# Altium footprint library PcbLib.PcbLib: 25 footprints (part 1 of 2)
Each footprint in its own frame and in the unit in brackets; x right, y up, seen from the top. Pads: shape width x height; smd on the part's side, far side on the other; paste and mask are expansions set on the pad; w line width, h text height; cw(c..) or ccw(c..) is an arc to the next point about the centre after c.
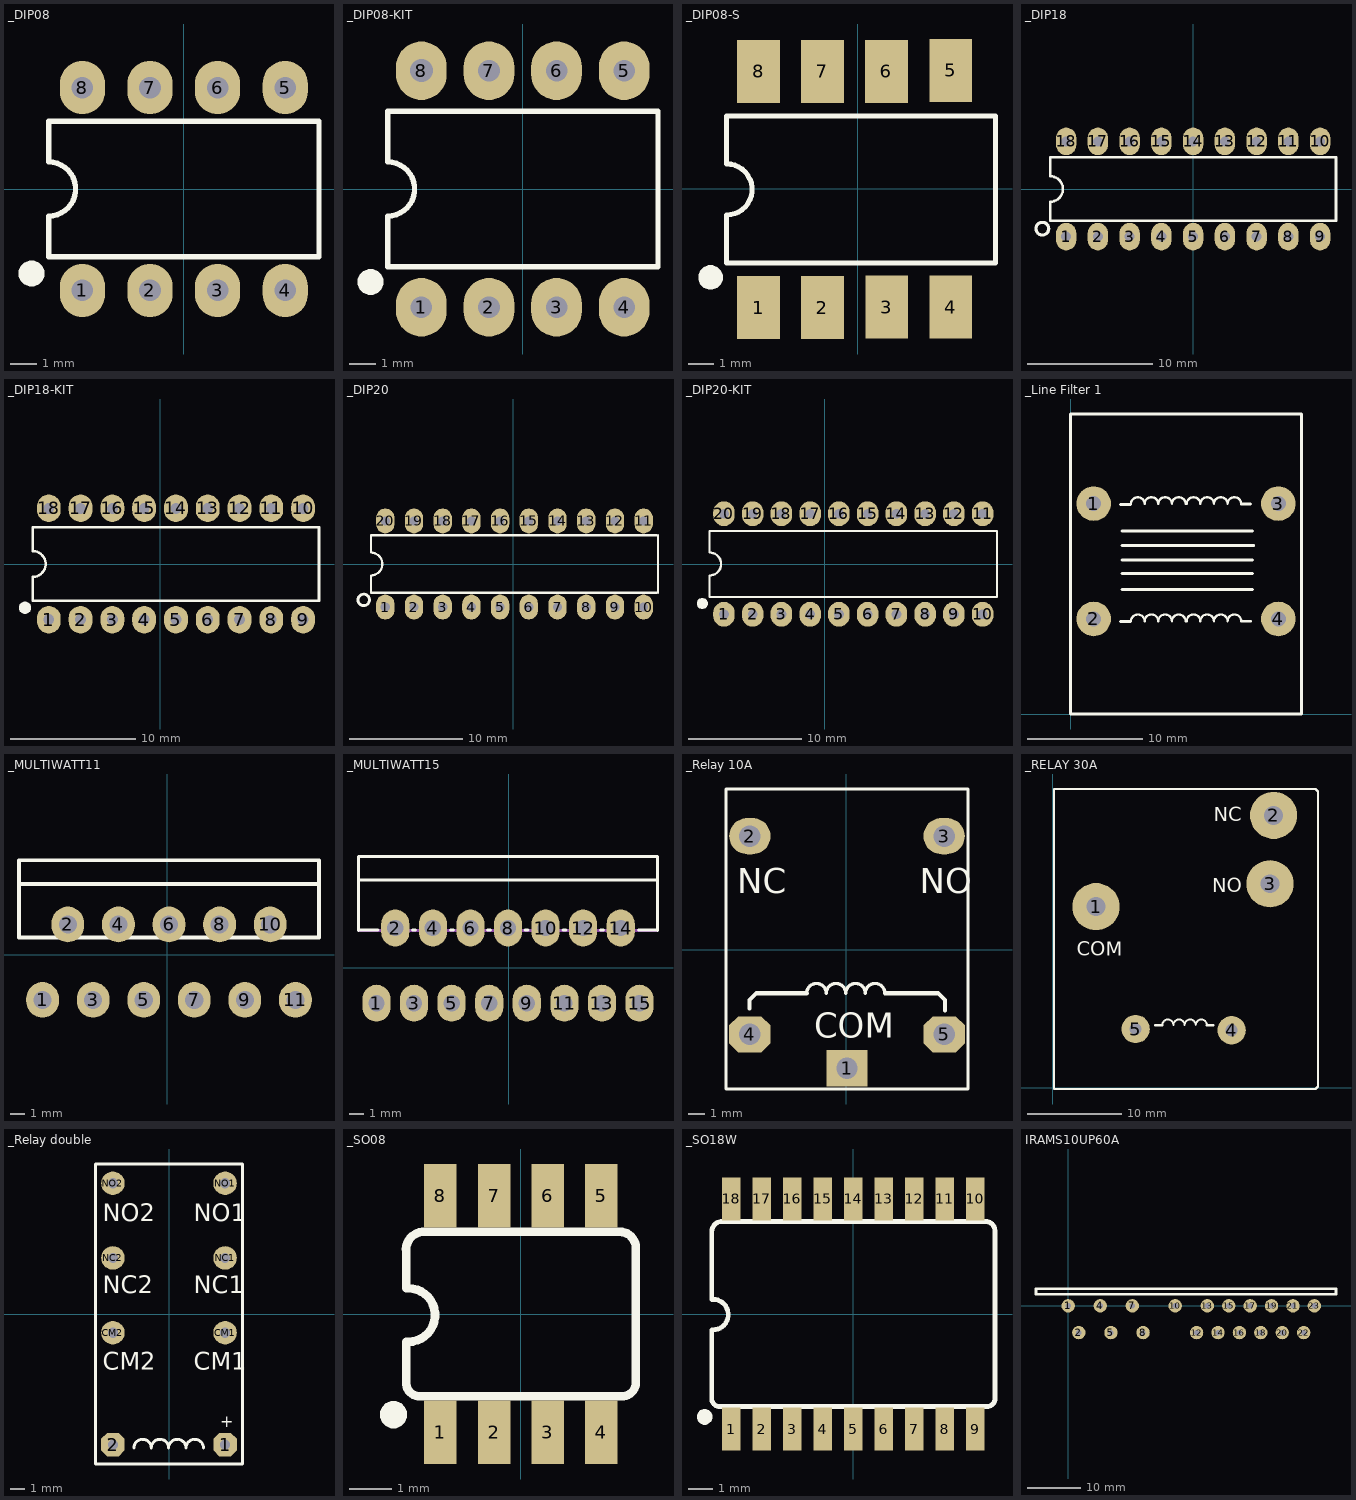
[diagram p0: the footprints below, top view; thin cyan lines are the x and y axes]

## _DIP08 [mm]
pads (8):
  oval 1.7x2 hole 0.813: 1(-3.81,-3.81) 2(-1.27,-3.81) 3(1.27,-3.81) 4(3.81,-3.81) 5(3.81,3.81) 6(1.27,3.81) 7(-1.27,3.81) 8(-3.81,3.81)
Top Overlay:
  region: -6.191,-3.175 -6.191,-3.08 -6.119,-2.905 -5.985,-2.771 -5.81,-2.699 -5.715,-2.699 -5.62,-2.699 -5.445,-2.771 -5.311,-2.905 -5.239,-3.08 -5.239,-3.175 -5.239,-3.27 -5.311,-3.445 -5.445,-3.579 -5.62,-3.651 -5.715,-3.651 -5.81,-3.651 -5.985,-3.579 -6.119,-3.445 -6.191,-3.27
  lines w0.203: -5.08,-2.54 5.08,-2.54 5.08,2.54 -5.08,2.54 -5.08,1.016 cw(c-5.08,0) -5.08,-1.016 -5.08,-2.54

## _DIP08-KIT [mm]
pads (8):
  oval 1.905x2.2 hole 0.813: 1(-3.81,-4.445) 2(-1.27,-4.445) 3(1.27,-4.445) 4(3.81,-4.445) 5(3.81,4.445) 6(1.27,4.445) 7(-1.27,4.445)
  oval 1.905x2.2 hole 0.864: 8(-3.81,4.445)
Top Overlay:
  region: -6.191,-3.492 -6.191,-3.398 -6.119,-3.223 -5.985,-3.089 -5.81,-3.016 -5.715,-3.016 -5.62,-3.016 -5.445,-3.089 -5.311,-3.223 -5.239,-3.398 -5.239,-3.492 -5.239,-3.587 -5.311,-3.762 -5.445,-3.896 -5.62,-3.969 -5.715,-3.969 -5.81,-3.969 -5.985,-3.896 -6.119,-3.762 -6.191,-3.587
  lines w0.203: -5.08,-2.921 -5.08,-1.016 ccw(c-5.08,0) -5.08,1.016 -5.08,2.921 5.08,2.921 5.08,-2.921 -5.08,-2.921
Top Solder:
  circle w0: c-3.81,4.445 r0.432
  circle w0: c-1.27,4.445 r0.432
  circle w0: c1.27,4.445 r0.432
  circle w0: c3.81,4.445 r0.432
  circle w0: c-3.81,-4.445 r0.432
  circle w0: c-1.27,-4.445 r0.432
  circle w0: c1.27,-4.445 r0.432
  circle w0: c3.81,-4.445 r0.432
Bottom Solder:
  circle w0: c-3.81,4.445 r1.067
  circle w0: c-1.27,4.445 r1.067
  circle w0: c1.27,4.445 r1.067
  circle w0: c3.81,4.445 r1.067
  circle w0: c-3.81,-4.445 r1.067
  circle w0: c-1.27,-4.445 r1.067
  circle w0: c1.27,-4.445 r1.067
  circle w0: c3.81,-4.445 r1.067

## _DIP08-S [mm]
pads (8):
  rect 1.7x2.5 smd: 1(-3.95,-4.718) 2(-1.41,-4.718) 3(1.143,-4.699) 4(3.683,-4.699) 5(3.683,4.699) 6(1.13,4.664) 7(-1.41,4.664) 8(-3.95,4.664)
Top Overlay:
  region: -6.331,-3.52 -6.331,-3.425 -6.259,-3.25 -6.125,-3.116 -5.95,-3.043 -5.855,-3.043 -5.76,-3.043 -5.585,-3.116 -5.451,-3.25 -5.379,-3.425 -5.379,-3.52 -5.379,-3.614 -5.451,-3.789 -5.585,-3.923 -5.76,-3.996 -5.855,-3.996 -5.95,-3.996 -6.125,-3.923 -6.259,-3.789 -6.331,-3.614
  lines w0.203: -5.22,-2.948 -5.22,-1.043 ccw(c-5.22,-0.027) -5.22,0.989 -5.22,2.894 5.461,2.894 5.461,-2.948 -5.22,-2.948
Top Solder:
  circle w0: c-3.95,4.664 r0.432
  circle w0: c-1.41,4.664 r0.432
  circle w0: c-3.95,-4.718 r0.432
  circle w0: c-1.41,-4.718 r0.432

## _DIP18 [mil]
pads (18):
  oval 64x86.61 hole 32: 1(-400,-150) 2(-300,-150) 3(-200,-150) 4(-100,-150) 5(0,-150) 6(100,-150) 7(200,-150) 8(300,-150) 9(400,-150) 10(400,150) 11(300,150) 12(200,150) 13(100,150) 14(0,150) 15(-100,150) 16(-200,150) 17(-300,150) 18(-400,150)
Top Overlay:
  circle w10: c-475,-125 r20
  lines w8: -450,-100 450,-100 450,100 -450,100 -450,40 cw(c-450,0) -450,-40 -450,-100

## _DIP18-KIT [mm]
pads (18):
  oval 1.905x2.2 hole 0.864: 1(-8.89,-4.445) 2(-6.35,-4.445) 3(-3.81,-4.445) 4(-1.27,-4.445) 5(1.27,-4.445) 6(3.81,-4.445) 7(6.35,-4.445) 8(8.89,-4.445) 9(11.43,-4.445) 10(11.43,4.445) 11(8.89,4.445) 12(6.35,4.445) 13(3.81,4.445) 14(1.27,4.445) 15(-1.27,4.445) 16(-3.81,4.445) 17(-6.35,4.445) 18(-8.89,4.445)
Top Overlay:
  region: -11.271,-3.492 -11.271,-3.398 -11.199,-3.223 -11.065,-3.089 -10.89,-3.016 -10.795,-3.016 -10.7,-3.016 -10.525,-3.089 -10.391,-3.223 -10.319,-3.398 -10.319,-3.492 -10.319,-3.587 -10.391,-3.762 -10.525,-3.896 -10.7,-3.969 -10.795,-3.969 -10.89,-3.969 -11.065,-3.896 -11.199,-3.762 -11.271,-3.587
  lines w0.203: -10.16,-2.921 -10.16,-1.016 ccw(c-10.16,0) -10.16,1.016 -10.16,2.921 12.7,2.921 12.7,-2.921 -10.16,-2.921
Top Solder:
  circle w0: c11.43,-4.445 r0.432
  circle w0: c11.43,4.445 r0.432
  circle w0: c-3.81,4.445 r0.432
  circle w0: c-1.27,4.445 r0.432
  circle w0: c1.27,4.445 r0.432
  circle w0: c3.81,4.445 r0.432
  circle w0: c6.35,4.445 r0.432
  circle w0: c8.89,4.445 r0.432
  circle w0: c8.89,-4.445 r0.432
  circle w0: c-6.35,-4.445 r0.432
  circle w0: c-3.81,-4.445 r0.432
  circle w0: c-1.27,-4.445 r0.432
  circle w0: c1.27,-4.445 r0.432
  circle w0: c3.81,-4.445 r0.432
  circle w0: c6.35,-4.445 r0.432
  circle w0: c-8.89,-4.445 r0.432
  circle w0: c-3.81,4.445 r0.432
  circle w0: c-3.81,4.445 r0.432
  circle w0: c-6.35,4.445 r0.432
  circle w0: c-8.89,4.445 r0.432
Bottom Solder:
  circle w0: c11.43,-4.445 r1.067
  circle w0: c11.43,4.445 r1.067
  circle w0: c-3.81,4.445 r1.067
  circle w0: c-1.27,4.445 r1.067
  circle w0: c1.27,4.445 r1.067
  circle w0: c3.81,4.445 r1.067
  circle w0: c6.35,4.445 r1.067
  circle w0: c8.89,4.445 r1.067
  circle w0: c8.89,-4.445 r1.067
  circle w0: c3.81,-4.445 r1.067
  circle w0: c6.35,-4.445 r1.067
  circle w0: c1.27,-4.445 r1.067
  circle w0: c-1.27,-4.445 r1.067
  circle w0: c-3.81,-4.445 r1.067
  circle w0: c-6.35,-4.445 r1.067
  circle w0: c-8.89,-4.445 r1.067
  circle w0: c-6.35,4.445 r1.067
  circle w0: c-8.89,4.445 r1.067

## _DIP20 [mil]
pads (20):
  oval 64x86.61 hole 32: 1(-445,-150) 2(-345,-150) 3(-245,-150) 4(-145,-150) 5(-45,-150) 6(55,-150) 7(155,-150) 8(255,-150) 9(355,-150) 10(455,-150) 11(455,150) 12(355,150) 13(255,150) 14(155,150) 15(55,150) 16(-45,150) 17(-145,150) 18(-245,150) 19(-345,150) 20(-445,150)
Top Overlay:
  circle w10: c-520,-125 r20
  lines w8: 500,-100 -495,-100 -495,-40 ccw(c-495,0) -495,40 -495,100 500,100 ; 505,-100 505,100

## _DIP20-KIT [mm]
pads (20):
  oval 1.905x2.2 hole 0.864: 1(-8.89,-4.445) 2(-6.35,-4.445) 3(-3.81,-4.445) 4(-1.27,-4.445) 5(1.27,-4.445) 6(3.81,-4.445) 7(6.35,-4.445) 8(8.89,-4.445) 9(11.43,-4.445) 10(13.97,-4.445) 11(13.97,4.445) 12(11.43,4.445) 13(8.89,4.445) 14(6.35,4.445) 15(3.81,4.445) 16(1.27,4.445) 17(-1.27,4.445) 18(-3.81,4.445) 19(-6.35,4.445) 20(-8.89,4.445)
Top Overlay:
  region: -11.271,-3.492 -11.271,-3.398 -11.199,-3.223 -11.065,-3.089 -10.89,-3.016 -10.795,-3.016 -10.7,-3.016 -10.525,-3.089 -10.391,-3.223 -10.319,-3.398 -10.319,-3.492 -10.319,-3.587 -10.391,-3.762 -10.525,-3.896 -10.7,-3.969 -10.795,-3.969 -10.89,-3.969 -11.065,-3.896 -11.199,-3.762 -11.271,-3.587
  lines w0.203: -10.16,-2.921 -10.16,-1.016 ccw(c-10.16,0) -10.16,1.016 -10.16,2.921 15.24,2.921 15.24,-2.921 -10.16,-2.921
Top Solder:
  circle w0: c11.43,-4.445 r0.432
  circle w0: c11.43,4.445 r0.432
  circle w0: c-3.81,4.445 r0.432
  circle w0: c-1.27,4.445 r0.432
  circle w0: c1.27,4.445 r0.432
  circle w0: c3.81,4.445 r0.432
  circle w0: c6.35,4.445 r0.432
  circle w0: c8.89,4.445 r0.432
  circle w0: c8.89,-4.445 r0.432
  circle w0: c-6.35,-4.445 r0.432
  circle w0: c-3.81,-4.445 r0.432
  circle w0: c-1.27,-4.445 r0.432
  circle w0: c1.27,-4.445 r0.432
  circle w0: c3.81,-4.445 r0.432
  circle w0: c6.35,-4.445 r0.432
  circle w0: c-8.89,-4.445 r0.432
  circle w0: c-3.81,4.445 r0.432
  circle w0: c-3.81,4.445 r0.432
  circle w0: c-6.35,4.445 r0.432
  circle w0: c-8.89,4.445 r0.432
  circle w0: c13.97,4.445 r0.432
  circle w0: c13.97,-4.445 r0.432
Bottom Solder:
  circle w0: c11.43,-4.445 r1.067
  circle w0: c11.43,4.445 r1.067
  circle w0: c-3.81,4.445 r1.067
  circle w0: c-1.27,4.445 r1.067
  circle w0: c1.27,4.445 r1.067
  circle w0: c3.81,4.445 r1.067
  circle w0: c6.35,4.445 r1.067
  circle w0: c8.89,4.445 r1.067
  circle w0: c8.89,-4.445 r1.067
  circle w0: c3.81,-4.445 r1.067
  circle w0: c6.35,-4.445 r1.067
  circle w0: c1.27,-4.445 r1.067
  circle w0: c-1.27,-4.445 r1.067
  circle w0: c-3.81,-4.445 r1.067
  circle w0: c-6.35,-4.445 r1.067
  circle w0: c-8.89,-4.445 r1.067
  circle w0: c-6.35,4.445 r1.067
  circle w0: c-8.89,4.445 r1.067
  circle w0: c13.97,4.445 r1.067
  circle w0: c13.97,-4.445 r1.067

## _Line Filter 1 [mm]
pads (4):
  round 3 hole 1.3: 1(2,18.238) 2(2,8.238) 3(18,18.238) 4(18,8.238)
Top Overlay:
  lines w0.2: 5.233,8.036 cw(c5.824,8.036) 6.415,8.036 cw(c7.006,8.036) 7.597,8.036 cw(c8.188,8.036) 8.779,8.036 cw(c9.37,8.036) 9.961,8.036 ; 5.233,18.196 cw(c5.824,18.196) 6.415,18.196 cw(c7.006,18.196) 7.597,18.196 cw(c8.188,18.196) 8.779,18.196 cw(c9.37,18.196) 9.961,18.196 ; 10.059,8.036 cw(c10.65,8.036) 11.241,8.036 cw(c11.832,8.036) 12.423,8.036 cw(c13.014,8.036) 13.605,8.036 cw(c14.196,8.036) 14.787,8.036 ; 10.059,18.196 cw(c10.65,18.196) 11.241,18.196 cw(c11.832,18.196) 12.423,18.196 cw(c13.014,18.196) 13.605,18.196 cw(c14.196,18.196) 14.787,18.196
  lines w0.25: 4.318,8.001 5.198,8.001 ; 4.318,18.161 5.198,18.161 ; 4.445,10.795 15.748,10.795 ; 4.445,12.192 15.748,12.192 ; 4.445,13.335 15.748,13.335 ; 4.445,14.605 15.875,14.605 ; 4.445,15.875 15.748,15.875 ; 14.787,8.036 15.586,8.036 ; 14.787,18.196 15.586,18.196 ; 0,0 0,19 0,26 20,26 20,0 0,0

## _MULTIWATT11 [mil] "Use For L6203"
height 760
pads (11):
  oval 86.61x94.49 hole 48: 1(-330,-120) 2(-263,80) 3(-196,-120) 4(-129,80) 5(-62,-120) 6(5,80) 7(72,-120) 8(139,80) 9(206,-120) 10(273,80) 11(340,-120)
Top Overlay:
  lines w10: -392.5,187 402.5,187 ; 402.5,195 402.5,197 ; -392.5,45 402.5,45 402.5,250 -392.5,250 -392.5,45
3D body: height 20, standoff -40, extent 322,-131 359,-109
3D body: height 20, standoff -40, extent 255,69 292,91
3D body: height 20, standoff -40, extent 188,-131 225,-109
3D body: height 20, standoff -40, extent 121,69 158,91
3D body: height 20, standoff -40, extent 54,-131 91,-109
3D body: height 20, standoff -40, extent -13,69 24,91
3D body: height 20, standoff -40, extent -80,-131 -43,-109
3D body: height 20, standoff -40, extent -147,69 -110,91
3D body: height 20, standoff -40, extent -214,-131 -177,-109
3D body: height 20, standoff -40, extent -281,69 -244,91
3D body: height 20, standoff -40, extent -348,-131 -311,-109

## _MULTIWATT15 [mm]
pads (15):
  oval 1.9x2.5 hole 1.1: 1(-8.95,-2.39) 2(-7.68,2.69) 3(-6.41,-2.39) 4(-5.14,2.69) 5(-3.87,-2.39) 6(-2.6,2.69) 7(-1.33,-2.39) 8(-0.06,2.69) 9(1.21,-2.39) 10(2.48,2.69) 11(3.75,-2.39) 12(5.02,2.69) 13(6.29,-2.39) 14(7.56,2.69) 15(8.83,-2.39)
Top Overlay:
  lines w0.203: -10.16,2.54 -10.16,5.94 ; -10.15,2.55 -8.85,2.55 ; -6.5,2.55 -6.3,2.55 ; -3.95,2.55 -3.75,2.55 ; -1.45,2.55 -1.25,2.55 ; 1.1,2.55 1.3,2.55 ; 3.65,2.55 3.85,2.55 ; 6.2,2.55 6.4,2.55 ; 8.75,2.55 10.05,2.55 ; 10.04,2.54 10.04,5.94 ; -10.16,5.94 10.04,5.94 ; -10.16,5.94 -10.16,7.54 10.04,7.54 10.04,5.94
Mechanical 16:
  lines w0.203: -10.16,2.54 10.04,2.54

## _Relay 10A [mm]
pads (5):
  rect 2.5x2.2 hole 1.3: 1(0.051,-7.177)
  oval 2.5x2.2 hole 1.3: 2(-5.824,6.873) 3(5.926,6.873)
  oct 2.5x2.2 hole 1.3: 4(-5.824,-5.127) 5(5.926,-5.127)
Top Overlay:
  lines w0.2: -2.387,-2.632 cw(c-1.796,-2.632) -1.205,-2.632 cw(c-0.614,-2.632) -0.023,-2.632 cw(c0.568,-2.632) 1.159,-2.632 cw(c1.75,-2.632) 2.341,-2.632 ; -7.274,-8.427 7.376,-8.427 7.376,9.723 -7.274,9.723 -7.274,-8.427
  lines w0.25: -5.842,-3.556 -5.842,-3.048 -5.426,-2.632 -2.387,-2.632 ; 2.341,-2.632 5.553,-2.632 5.969,-3.048 5.969,-3.683
  text "NC" at -6.604,3.429 h1.5
  text "NO" at 4.445,3.429 h1.5
  text "COM" at -1.93,-5.334 h1.5

## _RELAY 30A [mm]
pads (5):
  round 5 hole 2: 1(4.572,19.177) 2(23.368,28.829) 3(22.987,21.59)
  round 3 hole 1.3: 4(18.923,6.096) 5(8.763,6.223)
Top Overlay:
  lines w0.2: 11.583,6.639 cw(c12.174,6.639) 12.765,6.639 cw(c13.356,6.639) 13.947,6.639 cw(c14.538,6.639) 15.129,6.639 cw(c15.72,6.639) 16.311,6.639
  lines w0.25: 10.83,6.639 11.583,6.639 ; 16.311,6.639 16.983,6.639
  lines w0.254: 0.127,-0.127 0.127,31.623 27.813,31.623 28.067,31.369 28.067,0.127 27.813,-0.127 0.127,-0.127
  text "NC" at 17.018,28.194 h1.5
  text "NO" at 16.891,20.701 h1.5
  text "COM" at 2.515,13.97 h1.5

## _Relay double [mm]
height 11.95
pads (8):
  oct 1.6x1.6 hole 0.7: 1(3.81,-8.89) 2(-3.81,-8.89)
  round 1.6 hole 0.7: CM1(3.81,-1.27) CM2(-3.81,-1.27) NC1(3.81,3.81) NC2(-3.81,3.81) NO1(3.81,8.89) NO2(-3.81,8.89)
Top Overlay:
  lines w0.2: -2.387,-9.109 cw(c-1.796,-9.109) -1.205,-9.109 cw(c-0.614,-9.109) -0.023,-9.109 cw(c0.568,-9.109) 1.159,-9.109 cw(c1.75,-9.109) 2.341,-9.109 ; -5,-10.2 5,-10.2 5,10.2 -5,10.2 -5,-10.2
  text "CM2" at -4.5,-3.8 h1.2
  text "NC2" at -4.5,1.4 h1.2
  text "NO2" at -4.5,6.3 h1.2
  text "NO1" at 1.7,6.3 h1.2
  text "NC1" at 1.7,1.4 h1.2
  text "CM1" at 1.7,-3.8 h1.2
  text "+" at 3.5,-7.7 h0.8

## _SO08 [mm]
pads (8):
  rect 0.77x1.5 smd: 1(-1.905,-2.8) 2(-0.635,-2.8) 3(0.635,-2.8) 4(1.905,-2.8) 5(1.905,2.8) 6(0.635,2.8) 7(-0.635,2.8) 8(-1.905,2.8)
Top Overlay:
  region: -2.699,-2.381 -2.699,-2.318 -2.747,-2.201 -2.836,-2.112 -2.953,-2.064 -3.016,-2.064 -3.079,-2.064 -3.196,-2.112 -3.285,-2.201 -3.334,-2.318 -3.334,-2.381 -3.334,-2.444 -3.285,-2.561 -3.196,-2.65 -3.079,-2.699 -3.016,-2.699 -2.953,-2.699 -2.836,-2.65 -2.747,-2.561 -2.699,-2.444
  lines w0.203: -2.718,-0.66 -2.718,-1.665 ccw(c-2.387,-1.616) -2.337,-1.946 2.437,-1.946 ccw(c2.387,-1.615) 2.718,-1.565 2.718,1.565 ccw(c2.337,1.566) 2.337,1.946 -2.337,1.946 ccw(c-2.287,1.515) -2.718,1.465 ; -2.718,0.61 -2.718,1.453 ; -2.667,-0.66 ccw(c-2.667,-0.025) -2.667,0.61
Mechanical 16:
  rectangle: -2.159,-3.302 -1.651,-2.273
  rectangle: -0.889,-3.302 -0.381,-2.273
  rectangle: 0.381,-3.302 0.889,-2.273
  rectangle: 1.651,-3.302 2.159,-2.273
  rectangle: -0.889,2.286 -0.381,3.302
  rectangle: 0.381,2.286 0.889,3.302
  rectangle: 1.651,2.286 2.159,3.302
  rectangle: -2.159,2.286 -1.651,3.302

## _SO18W [mm]
pads (18):
  rect 0.77x1.8 smd: 1(-5.08,-4.788) 2(-3.81,-4.788) 3(-2.54,-4.788) 4(-1.27,-4.788) 5(0,-4.788) 6(1.27,-4.788) 7(2.54,-4.788) 8(3.81,-4.788) 9(5.08,-4.788) 10(5.08,4.788) 11(3.81,4.788) 12(2.54,4.788) 13(1.27,4.788) 14(0,4.788) 15(-1.27,4.788) 16(-2.54,4.788) 17(-3.81,4.788) 18(-5.08,4.788)
Top Overlay:
  region: -5.874,-4.286 -5.874,-4.223 -5.922,-4.106 -6.011,-4.017 -6.128,-3.969 -6.191,-3.969 -6.254,-3.969 -6.371,-4.017 -6.46,-4.106 -6.509,-4.223 -6.509,-4.286 -6.509,-4.349 -6.46,-4.466 -6.371,-4.555 -6.254,-4.604 -6.191,-4.604 -6.128,-4.604 -6.011,-4.555 -5.922,-4.466 -5.874,-4.349
  lines w0.203: -5.893,-0.66 -5.893,-3.57 ccw(c-5.562,-3.521) -5.512,-3.851 5.612,-3.851 ccw(c5.562,-3.52) 5.893,-3.47 5.893,3.47 ccw(c5.512,3.471) 5.512,3.851 -5.512,3.851 ccw(c-5.462,3.42) -5.893,3.37 ; -5.893,0.61 -5.893,3.358 ; -5.842,-0.66 ccw(c-5.842,-0.025) -5.842,0.61

## IRAMS10UP60A [mm]
pads (19):
  round 2.5 hole 1: 1(0,0) 2(2,-5) 4(6,0) 5(8,-5) 7(12,0) 8(14,-5) 10(20,0) 12(24,-5) 13(26,0) 14(28,-5) 15(30,0) 16(32,-5) 17(34,0) 18(36,-5) 19(38,0) 20(40,-5) 21(42,0) 22(44,-5) 23(46,0)
Top Overlay:
  lines w0.5: 50,3.2 -6,3.2 -6,2.159 50.038,2.159 50.038,3.162